# Altium footprint library MMT_MCUs_ICs.PcbLib: 44 footprints (part 1 of 3)
Each footprint in its own frame and in the unit in brackets; x right, y up, seen from the top. Pads: shape width x height; smd on the part's side, far side on the other; paste and mask are expansions set on the pad; w line width, h text height; cw(c..) or ccw(c..) is an arc to the next point about the centre after c.
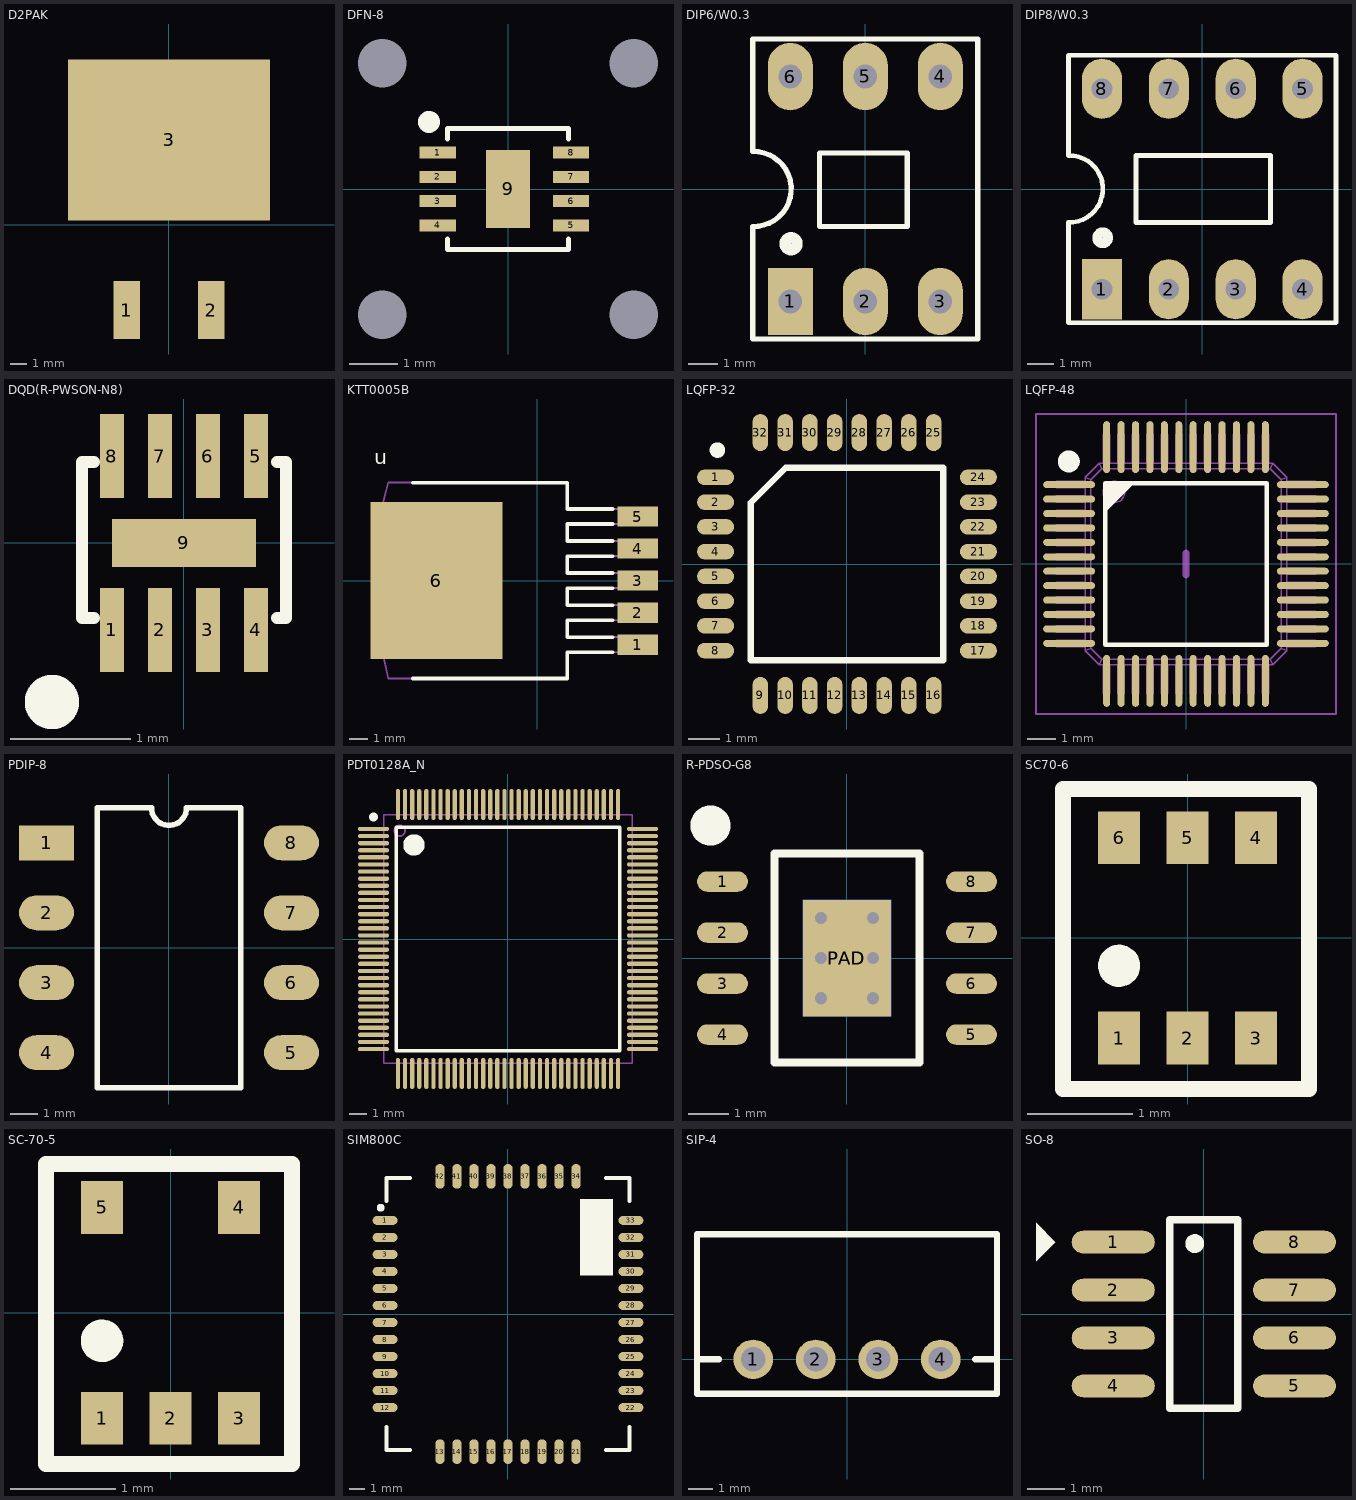
[diagram p0: the footprints below, top view; thin cyan lines are the x and y axes]

## D2PAK [mm]
height 4.5
pads (3):
  rect 1.6x3.5 smd: 1(-2.54,-5.138) 2(2.54,-5.138)
  rect 12.2x9.75 smd: 3(0,5.138)
3D body "User Library-TO263-3S.STEP": height 4.68, standoff -0.12, extent -5,-6.49 5,9.18

## DFN-8 [mm]
pads (13):
  rect 0.75x0.25 smd: 1(-1.45,0.75) 2(-1.45,0.25) 3(-1.45,-0.25) 4(-1.45,-0.75) 5(1.3,-0.75) 6(1.3,-0.25) 7(1.3,0.25) 8(1.3,0.75)
  rect 0.9x1.6 smd: 9(0,0)
  rect 0x0 hole 1: ""(-2.595,-2.595) ""(-2.595,2.595) ""(2.595,-2.595) ""(2.595,2.595)
Top Overlay:
  circle w0.254: c-1.631,1.384 r0.1
  lines w0.1: -1.25,-1.029 -1.25,-1.25 1.25,-1.25 1.25,-1.029 ; -1.25,1.028 -1.25,1.25 1.25,1.25 1.25,1.028
3D body "User Library-sht3x-1.STEP": height 0.9, standoff 0, extent -1.255,-1.218 1.245,1.282
3D body "User Library-Humidity_SF2.STEP": height 2.03, standoff -1.5, extent -3.205,-3.213 3.195,3.187

## DIP6/W0.3 [mil] "6 PIN, W 300mil, Pin to pin 100mil"
height 100
pads (6):
  rect 60x90 hole 31.5: 1(-100,-150)
  oval 60x90 hole 31.5: 2(0,-150) 3(100,-150) 4(100,150) 5(0,150) 6(-100,150)
Top Overlay:
  circle w15: c-99,-73 r8
  lines w7: -150.38,-49.95 ccw(c-148.69,0.02) -150,50 ; -150,-50 -150,-200 150,-200 150,200 -150,200 -150,51 ; -61,-50 56,-50 56,48 -61,48 -61,-50
3D body "SW3DPS-DIP6-DEFAULT.STEP": height 169.69, standoff -129.13, extent -158.11,-157.48 160,157.48

## DIP8/W0.3 [mil] "8 PIN, W 300mil, Pin to pin 100mil"
height 100
pads (8):
  rect 60x90 hole 31: 1(-150,-150)
  oval 60x90 hole 31: 2(-50,-150) 3(50,-150) 4(150,-150) 5(150,150) 6(50,150) 7(-50,150) 8(-150,150)
Top Overlay:
  circle w15: c-149,-73 r8
  lines w7: -200.38,-49.95 ccw(c-198.69,0.02) -200,50 ; -200,-50 -200,-200 200,-200 200,200 -200,200 -200,51 ; -99,-50 -99,50 102,50 102,-50 -99,-50
3D body "SW3dPS-DIP8-CER.STEP": height 201.25, standoff -129.47, extent -200,-190 200,186.4

## DQD(R-PWSON-N8) [mm]
pads (9):
  rect 0.2x0.7 smd mask+0.05: 1(-0.6,-0.725) 2(-0.2,-0.725) 3(0.2,-0.725) 4(0.6,-0.725) 5(0.6,0.725) 6(0.2,0.725) 7(-0.2,0.725) 8(-0.6,0.725)
  rect 1.2x0.4 smd mask+0.05: 9(0,0)
Top Overlay:
  circle w0.254: c-1.1,-1.325 r0.1
  lines w0.1: -0.75,-0.625 -0.85,-0.625 -0.85,0.675 -0.75,0.675 ; 0.775,-0.625 0.85,-0.625 0.85,0.675 0.775,0.675
3D body: height 0.75, standoff 0.05, extent -0.85,-0.625 0.85,0.675

## KTT0005B [mm]
pads (6):
  rect 2.16x1.07 smd: 1(5.338,-3.4) 2(5.338,-1.7) 3(5.338,0.005) 4(5.338,1.7) 5(5.338,3.4)
  rect 6.99x8.33 smd: 6(-5.338,0)
Top Overlay:
  lines w0.2: -6.6,-5.2 1.6,-5.2 1.6,-3.8 4,-3.8 ; -6.6,5.2 1.6,5.2 1.6,3.8 4,3.8 ; 4,-3 1.6,-3 1.6,-2.1 4,-2.1 ; 4,-1.3 1.6,-1.3 1.6,-0.4 4,-0.4 ; 4,0.4 1.6,0.4 1.6,1.3 4,1.3 ; 4,2.1 1.6,2.1 1.6,3 4,3
  text "u" at -8.636,6.172 h0.79
Mechanical 1:
  lines w0.1: -8.3,-3.3 -7.9,-5.2 1.6,-5.2 1.6,-3.8 6,-3.8 6,-3 1.6,-3 1.6,-2.1 6,-2.1 6,-1.3 1.6,-1.3 1.6,-0.4 6,-0.4 6,0.4 1.6,0.4 1.6,1.3 6,1.3 6,2.1 1.6,2.1 1.6,3 6,3 6,3.8 1.6,3.8 1.6,5.2 -7.9,5.2 -8.3,3.6 -8.3,-3.3
3D body "3d.stp": height 4.57, standoff -0.15, extent -8.039,-5.08 6.261,5.08

## LQFP-32 [mm] "LQFP32; Body size 7x7mm; Height 1.6mm; Pitch 0.8mm."
pads (32):
  oval 1.2x0.5 smd: 1(-4.25,2.8) 2(-4.25,2) 3(-4.25,1.2) 4(-4.25,0.4) 5(-4.25,-0.4) 6(-4.25,-1.2) 7(-4.25,-2) 8(-4.25,-2.8) 17(4.25,-2.8) 18(4.25,-2) 19(4.25,-1.2) 20(4.25,-0.4) 21(4.25,0.4) 22(4.25,1.2) 23(4.25,2) 24(4.25,2.8)
  oval 0.5x1.2 smd: 9(-2.8,-4.25) 10(-2,-4.25) 11(-1.2,-4.25) 12(-0.4,-4.25) 13(0.4,-4.25) 14(1.2,-4.25) 15(2,-4.25) 16(2.8,-4.25) 25(2.8,4.25) 26(2,4.25) 27(1.2,4.25) 28(0.4,4.25) 29(-0.4,4.25) 30(-1.2,4.25) 31(-2,4.25) 32(-2.8,4.25)
Top Overlay:
  circle w0.25: c-4.191,3.683 r0.125
  lines w0.2: -3.115,-3.115 3.115,-3.115 3.115,3.115 -1.98,3.115 -3.115,1.98 -3.115,-3.115
3D body "User Library-LQFP32-2.STEP": height 1.62, standoff -0.01, extent -4.572,-4.572 4.572,4.572

## LQFP-48 [mm] "Thin QFP, 48-Leads, Body 7x7mm, Pitch 0.5mm, IPC Medium Density"
height 1.6
pads (49):
  oval 0.241x1 on Mech15: 0(0,0)
  oval 1.8x0.241 smd: 1(-4.05,2.75) 2(-4.05,2.25) 3(-4.05,1.75) 4(-4.05,1.25) 5(-4.05,0.75) 6(-4.05,0.25) 7(-4.05,-0.25) 8(-4.05,-0.75) 9(-4.05,-1.25) 10(-4.05,-1.75) 11(-4.05,-2.25) 12(-4.05,-2.75) 25(4.05,-2.75) 26(4.05,-2.25) 27(4.05,-1.75) 28(4.05,-1.25) 29(4.05,-0.75) 30(4.05,-0.25) 31(4.05,0.25) 32(4.05,0.75) 33(4.05,1.25) 34(4.05,1.75) 35(4.05,2.25) 36(4.05,2.75)
  oval 0.241x1.8 smd: 13(-2.75,-4.05) 14(-2.25,-4.05) 15(-1.75,-4.05) 16(-1.25,-4.05) 17(-0.75,-4.05) 18(-0.25,-4.05) 19(0.25,-4.05) 20(0.75,-4.05) 21(1.25,-4.05) 22(1.75,-4.05) 23(2.25,-4.05) 24(2.75,-4.05) 37(2.75,4.05) 38(2.25,4.05) 39(1.75,4.05) 40(1.25,4.05) 41(0.75,4.05) 42(0.25,4.05) 43(-0.25,4.05) 44(-0.75,4.05) 45(-1.25,4.05) 46(-1.75,4.05) 47(-2.25,4.05) 48(-2.75,4.05)
Top Overlay:
  circle w0.381: c-4.064,3.556 r0.191
  region: -2.794,2.794 -1.794,2.794 -2.794,1.794
  lines w0.152: -2.794,-2.794 -2.794,2.794 2.794,2.794 2.794,-2.794 -2.794,-2.794
Mechanical 13:
  drawing of 361 lines, arcs and shapes, not listed
Mechanical 15:
  lines w0.076: -5.2,-5.2 -5.2,5.2 5.2,5.2 5.2,-5.2 -5.2,-5.2
3D body "LQFP-48.STEP": height 1.59, standoff -0.01, extent -4.5,-4.5 4.5,4.5

## PDIP-8 [mm]
pads (8):
  rect 2x1.27 smd: 1(-4.45,3.81)
  oval 2x1.27 smd: 2(-4.45,1.27) 3(-4.45,-1.27) 4(-4.45,-3.81) 5(4.45,-3.81) 6(4.45,-1.27) 7(4.45,1.27) 8(4.45,3.81)
Top Overlay:
  lines w0.2: -2.615,-5.08 2.615,-5.08 2.615,5.08 0.635,5.08 cw(c0,5.08) -0.635,5.08 -2.615,5.08 -2.615,-5.08
3D body "User Library-ncp101xapl.STEP": height 3.63, standoff 0, extent -4.826,-4.753 4.826,4.752

## PDT0128A_N [mm]
pads (128):
  oval 1.75x0.24 smd paste-0.102 mask+0.051: 1(-7.575,6.2) 2(-7.575,5.8) 3(-7.575,5.4) 4(-7.575,5) 5(-7.575,4.6) 6(-7.575,4.2) 7(-7.575,3.8) 8(-7.575,3.4) 9(-7.575,3) 10(-7.575,2.6) 11(-7.575,2.2) 12(-7.575,1.8) 13(-7.575,1.4) 14(-7.575,1) 15(-7.575,0.6) 16(-7.575,0.2) 17(-7.575,-0.2) 18(-7.575,-0.6) 19(-7.575,-1) 20(-7.575,-1.4) 21(-7.575,-1.8) 22(-7.575,-2.2) 23(-7.575,-2.6) 24(-7.575,-3) 25(-7.575,-3.4) 26(-7.575,-3.8) 27(-7.575,-4.2) 28(-7.575,-4.6) 29(-7.575,-5) 30(-7.575,-5.4) 31(-7.575,-5.8) 32(-7.575,-6.2) 65(7.575,-6.2) 66(7.575,-5.8) 67(7.575,-5.4) 68(7.575,-5) 69(7.575,-4.6) 70(7.575,-4.2) 71(7.575,-3.8) 72(7.575,-3.4) 73(7.575,-3) 74(7.575,-2.6) 75(7.575,-2.2) 76(7.575,-1.8) 77(7.575,-1.4) 78(7.575,-1) 79(7.575,-0.6) 80(7.575,-0.2) 81(7.575,0.2) 82(7.575,0.6) 83(7.575,1) 84(7.575,1.4) 85(7.575,1.8) 86(7.575,2.2) 87(7.575,2.6) 88(7.575,3) 89(7.575,3.4) 90(7.575,3.8) 91(7.575,4.2) 92(7.575,4.6) 93(7.575,5) 94(7.575,5.4) 95(7.575,5.8) 96(7.575,6.2)
  oval 0.24x1.75 smd paste-0.102 mask+0.051: 33(-6.2,-7.575) 34(-5.8,-7.575) 35(-5.4,-7.575) 36(-5,-7.575) 37(-4.6,-7.575) 38(-4.2,-7.575) 39(-3.8,-7.575) 40(-3.4,-7.575) 41(-3,-7.575) 42(-2.6,-7.575) 43(-2.2,-7.575) 44(-1.8,-7.575) 45(-1.4,-7.575) 46(-1,-7.575) 47(-0.6,-7.575) 48(-0.2,-7.575) 49(0.2,-7.575) 50(0.6,-7.575) 51(1,-7.575) 52(1.4,-7.575) 53(1.8,-7.575) 54(2.2,-7.575) 55(2.6,-7.575) 56(3,-7.575) 57(3.4,-7.575) 58(3.8,-7.575) 59(4.2,-7.575) 60(4.6,-7.575) 61(5,-7.575) 62(5.4,-7.575) 63(5.8,-7.575) 64(6.2,-7.575) 97(6.2,7.575) 98(5.8,7.575) 99(5.4,7.575) 100(5,7.575) 101(4.6,7.575) 102(4.2,7.575) 103(3.8,7.575) 104(3.4,7.575) 105(3,7.575) 106(2.6,7.575) 107(2.2,7.575) 108(1.8,7.575) 109(1.4,7.575) 110(1,7.575) 111(0.6,7.575) 112(0.2,7.575) 113(-0.2,7.575) 114(-0.6,7.575) 115(-1,7.575) 116(-1.4,7.575) 117(-1.8,7.575) 118(-2.2,7.575) 119(-2.6,7.575) 120(-3,7.575) 121(-3.4,7.575) 122(-3.8,7.575) 123(-4.2,7.575) 124(-4.6,7.575) 125(-5,7.575) 126(-5.4,7.575) 127(-5.8,7.575) 128(-6.2,7.575)
Top Overlay:
  circle w0.25: c-7.575,6.87 r0.125
  circle w0.6: c-5.3,5.3 r0.3
  lines w0.2: -6.3,-6.3 -6.3,6.3 6.3,6.3 6.3,-6.3 -6.3,-6.3
Mechanical 13:
  circle w0.1: c-6.1,6.1 r0.3
  lines w0.1: -7,-7 -7,7 7,7 7,-7 -7,-7
3D body "PDT0128A.stp": height 1.05, standoff -0.02, extent -8,-8 8,8

## R-PDSO-G8 [mm]
height 1.7
pads (10):
  oval 1.27x0.51 smd: 1(-3.1,1.905) 2(-3.1,0.635) 3(-3.1,-0.635) 4(-3.1,-1.905) 5(3.1,-1.905) 6(3.1,-0.635) 7(3.1,0.635) 8(3.1,1.905)
  rect 2.2x2.9 smd: PAD(0,0)
  rect 2.2x2.9 smd far side: PAD(0,0)
via 0.65,0 diameter 0.5 hole 0.3
via -0.65,0 diameter 0.5 hole 0.3
via 0.65,1 diameter 0.5 hole 0.3
via 0.65,-1 diameter 0.5 hole 0.3
via -0.65,1 diameter 0.5 hole 0.3
via -0.65,-1 diameter 0.5 hole 0.3
Top Overlay:
  circle w0.5: c-3.4,3.3 r0.25
  lines w0.2: -1.8,-2.6 -1.8,2.6 1.8,2.6 1.8,-2.6 -1.8,-2.6
Mechanical 15:
  lines w0.1: -0.5,0 0.5,0 ; 0,-0.5 0,0.5
3D body "User Library-TPS54360DDA.step": height 1.58, standoff -0.01, extent -3.094,-2.5 3.106,2.5

## SC70-6 [mm]
pads (6):
  rect 0.4x0.5 smd: 1(-0.65,-0.95) 2(0,-0.95) 3(0.65,-0.95) 4(0.65,0.95) 5(0,0.95) 6(-0.65,0.95)
Top Overlay:
  circle w0.2: c-0.65,-0.264 r0.1
  lines w0.152: -1.183,-1.433 -1.183,1.412 1.153,1.412 1.153,-1.433 -1.183,-1.433
3D body "User Library-SC88-6.step": height 1.1, standoff 0, extent -1.015,-1.102 0.985,1.098

## SC-70-5 [mm]
pads (5):
  rect 0.4x0.5 smd: 1(-0.65,-1) 2(0,-1) 3(0.65,-1) 4(0.65,1) 5(-0.65,1)
Top Overlay:
  circle w0.203: c-0.65,-0.264 r0.1
  lines w0.152: -1.183,-1.433 1.153,-1.433 1.153,1.412 -1.183,1.412 -1.183,-1.433
3D body "User Library-SOT353-1.STEP": height 1.1, standoff 0, extent -1.115,-1.202 1.085,1.198

## SIM800C [mm]
pads (42):
  oval 1.6x0.6 smd: 1(-7.95,6.05) 2(-7.95,4.95) 3(-7.95,3.85) 4(-7.95,2.75) 5(-7.95,1.65) 6(-7.95,0.55) 7(-7.95,-0.55) 8(-7.95,-1.65) 9(-7.95,-2.75) 10(-7.95,-3.85) 11(-7.95,-4.95) 12(-7.95,-6.05) 22(7.95,-6.05) 23(7.95,-4.95) 24(7.95,-3.85) 25(7.95,-2.75) 26(7.95,-1.65) 27(7.95,-0.55) 28(7.95,0.55) 29(7.95,1.65) 30(7.95,2.75) 31(7.95,3.85) 32(7.95,4.95) 33(7.95,6.05)
  oval 0.6x1.6 smd: 13(-4.4,-8.9) 14(-3.3,-8.9) 15(-2.2,-8.9) 16(-1.1,-8.9) 17(0,-8.9) 18(1.1,-8.9) 19(2.2,-8.9) 20(3.3,-8.9) 21(4.4,-8.9) 34(4.4,8.9) 35(3.3,8.9) 36(2.2,8.9) 37(1.1,8.9) 38(0,8.9) 39(-1.1,8.9) 40(-2.2,8.9) 41(-3.3,8.9) 42(-4.4,8.9)
Top Overlay:
  circle w0.254: c-8.23,6.869 r0.127
  rectangle: 4.65,2.48 6.8,7.43
  lines w0.254: -7.85,-7.3 -7.85,-8.8 -6.35,-8.8 ; -7.85,7.3 -7.85,8.8 -6.35,8.8 ; 6.35,-8.8 7.85,-8.8 7.85,-7.3 ; 6.35,8.8 7.85,8.8 7.85,7.3
3D body "User Library-SIM800C.STEP": height 2.33, standoff 0.02, extent -7.85,-8.8 7.85,8.8

## SIP-4 [mm]
pads (4):
  round 1.6 hole 1: 1(-3.81,0) 2(-1.27,0) 3(1.27,0) 4(3.81,0)
Top Overlay:
  lines w0.254: -6.096,0 -5.207,0 ; 5.207,0 6.096,0 ; -6.096,-1.397 -6.096,-0.286 -6.096,5.08 6.096,5.08 6.096,-1.397 -6.096,-1.397
3D body "User Library-4-Lead SIP_AM1S-1205SZ_Aimtec_DC-DC_Converter_1_Watt.step": height 10.15, standoff -3.05, extent -5.842,-1.174 5.842,4.826

## SO-8 [mm] "8-Pin Small Outline Integrated Circuit 1.27 mm Pitch, IPC Medium Density"
height 1.75
pads (8):
  oval 2.2x0.6 smd: 1(-2.4,1.905) 2(-2.4,0.635) 3(-2.4,-0.635) 4(-2.4,-1.905) 5(2.4,-1.905) 6(2.4,-0.635) 7(2.4,0.635) 8(2.4,1.905)
Top Overlay:
  circle w0.25: c-0.241,1.866 r0.125
  region: -4.445,1.397 -3.937,1.905 -4.445,2.413
  lines w0.2: -0.9,-2.5 0.9,-2.5 0.9,2.5 -0.9,2.5 -0.9,-2.5
3D body "User Library-SOIC-8.STEP": height 1.75, standoff 0, extent -2.93,-2.511 3.082,2.489